# Altium footprint library My Library.PcbLib: 872 footprints (part 16 of 55)
Each footprint in its own frame and in the unit in brackets; x right, y up, seen from the top. Pads: shape width x height; smd on the part's side, far side on the other; paste and mask are expansions set on the pad; w line width, h text height; cw(c..) or ccw(c..) is an arc to the next point about the centre after c.
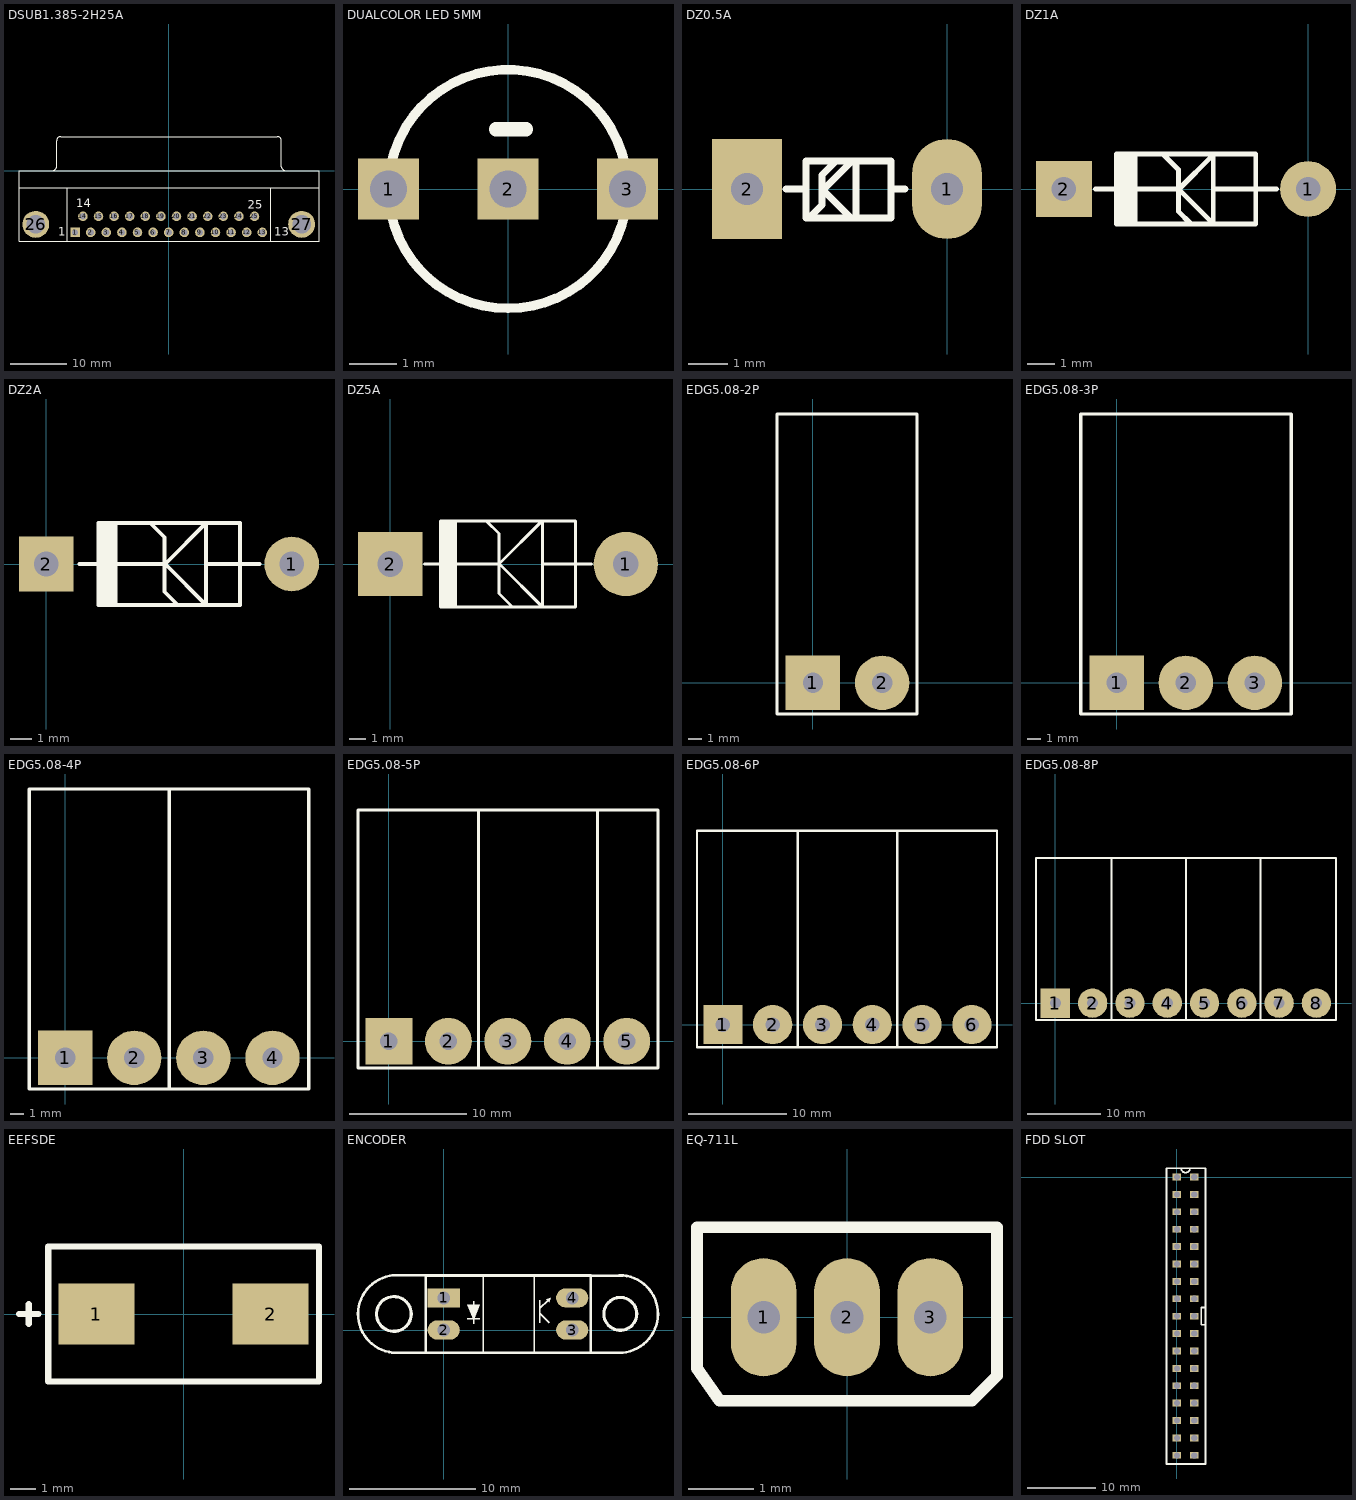
[diagram p15: the footprints below, top view; thin cyan lines are the x and y axes]

## DSUB1.385-2H25A [mm] "Connector; D Subminiature; 25 Position; Right Angle; Pitch 1.385 mm"
height 12.93
pads (27):
  rect 1.69x1.69 hole 1.09: 1(-16.566,-10.92)
  round 1.69 hole 1.09: 2(-13.805,-10.92) 3(-11.044,-10.92) 4(-8.283,-10.92) 5(-5.522,-10.92) 6(-2.761,-10.92) 7(0,-10.92) 8(2.761,-10.92) 9(5.522,-10.92) 10(8.283,-10.92) 11(11.044,-10.92) 12(13.805,-10.92) 13(16.566,-10.92) 14(-15.185,-8.08) 15(-12.424,-8.08) 16(-9.663,-8.08) 17(-6.902,-8.08) 18(-4.141,-8.08) 19(-1.38,-8.08) 20(1.381,-8.08) 21(4.142,-8.08) 22(6.903,-8.08) 23(9.664,-8.08) 24(12.425,-8.08) 25(15.186,-8.08)
  round 4.76 hole 3.26: 26(-23.526,-9.5) 27(23.526,-9.5)
Top Overlay:
  lines w0.2: -26.496,-3 26.604,-3 ; -20.541,0.005 ccw(c-20.541,0.7) -19.846,0.7 -19.846,5.3 ; -19.841,5.305 cw(c-19.146,5.305) -19.146,6 19.254,6 cw(c19.254,5.305) 19.949,5.305 ; -17.946,-12.5 -17.946,-3 ; 18.054,-12.5 18.054,-3 ; 19.954,5.3 19.954,0.7 ccw(c20.649,0.7) 20.649,0.005 ; -26.496,-12.5 -26.496,0 26.604,0 26.604,-12.5 -26.496,-12.5
  text "25" at 13.97,-6.731 h1.5
  text "14" at -16.383,-6.477 h1.5
  text "13" at 18.669,-11.557 h1.5
  text "1" at -19.558,-11.557 h1.5
3D body "SW3dPS-d-sub25 connector.STEP": height 12.57, standoff -4.58, extent -26.492,-12.497 26.548,8.003

## DUALCOLOR LED 5MM [mil]
pads (3):
  rect 51.17x51.17 / inner rect 52x52 / far side rect 51.17x51.17 hole 31: 1(-100,0)
  rect 51.17x51.17 / inner round 52 / far side rect 51.17x51.17 hole 31: 2(0,0) 3(100,0)
Top Overlay:
  lines w8: 80.64,59.14 cw(c0,0) 100,0 ; 100,0 cw(c0,0) 0,-100 cw(c0,0) -100,0 cw(c0,0) 100,0
  lines w11.82: -10,50 15,50

## DZ0.5A [mil] "Diode Zenner, W 80mil, L 300mil"
height 80
pads (2):
  oval 70x100 hole 32: 1(0,0)
  rect 70x100 hole 32: 2(-200,0)
Top Overlay:
  lines w7: -161,0 -141,0 ; -138,-29 -125,-16 -125,14 -111.5,27.5 ; -125,-2 -125,0 ; -95,28 -123,0 -125,0 ; -91,28 -91,-27 -89,-29 -93,-29 -96,-29 -125,0 ; -56,0 -42,0 ; -141,-29 -56,-29 -56,28 -141,28 -141,-29

## DZ1A [mil] "Diode 1A, W 100mil, L 350mil"
height 100
pads (2):
  round 80 hole 35: 1(0,0)
  rect 80x80 hole 35: 2(-350,0)
Top Overlay:
  region: -275,50 -275,-50 -245,-50 -245,50
  lines w7: -305,0 -275,0 ; -275,-16 -275,0 ; -275,21 -275,0 ; -255,0 -190,0 ; -208,50 -186,28 -186,-32 -168.5,-49.5 ; -185.5,-0.5 -136,-50 -136,50 -136,49 -185,0 -185,-1 ; -135,0 -75,0 -45,0 ; -275,0 -275,-50 -75,-50 -75,50 -275,50 -275,0
3D body "SW3dPS-Zener 1W.STEP": height 120.61, standoff -50, extent -346,-65 -15,40

## DZ2A [mil] "Diode 2A, W 150mil, L 450mil"
height 100
pads (2):
  round 100 hole 45: 1(450,0)
  rect 100x100 hole 45: 2(0,0)
Top Overlay:
  region: 95,75 95,-75 130,-75 130,75
  lines w7: 61,0 96,0 ; 96,-31 96,0 ; 96,32 96,0 ; 115,0 215,0 ; 194,72 217,49 217,-51 239,-73 ; 218,1 218,0 ; 295,0 360,0 ; 355,0 391,0 ; 218,0 293,-75 293,75 218,0 ; 96,-75 355,-75 355,75 96,75 96,-75
3D body "SW3DPS-DIODE0_4-DEFAULT.STEP": height 100.5, standoff -100, extent -5,-46 425,55

## DZ5A [mil] "Diode 5A, W 200mil, L 550mil"
height 150
pads (2):
  round 150 hole 60: 1(550,0)
  rect 150x150 hole 60: 2(0,0)
Top Overlay:
  region: 115,100 115,-100 155,-100 155,100
  lines w7: 80,0 118,0 ; 118,-44 118,0 ; 118,46 118,0 ; 150,0 255,0 355,-100 355,100 354,100 254,0 ; 225,100 254,71 ; 254,-5 254,6 ; 254,70 254,-69 283,-98 ; 355,0 435,0 ; 432,0 470,0 ; 118,-100 118,100 432,100 432,-100 118,-100

## EDG5.08-2P [mm]
pads (2):
  rect 4x4 hole 1.5: 1(0,0)
  round 4 hole 1.5: 2(5.08,0)
Top Overlay:
  lines w0.254: -2.642,-2.286 -2.642,19.761 7.645,19.761 7.645,-2.286 -2.642,-2.286
3D body "User Library-MSTB 2,5-2-G 1754436.STEP": height 8.61, standoff -3.49, extent -2.435,-2.007 7.565,9.993
3D body "1911965.stp": height 15.01, standoff 0.01, extent -2.515,1.441 7.645,19.641

## EDG5.08-3P [mm]
pads (3):
  rect 4x4 hole 1.5: 1(0,0)
  round 4 hole 1.5: 2(5.08,0) 3(10.16,0)
Top Overlay:
  lines w0.254: -2.642,-2.286 -2.642,19.761 12.827,19.761 12.827,-2.286 -2.642,-2.286
3D body "1911965.stp": height 15.01, standoff 0.01, extent 2.565,1.441 12.725,19.641
3D body "User Library-MSTB 2,5-2-G 1754436.STEP": height 8.61, standoff -3.49, extent 2.645,-2.007 12.645,9.993
3D body "User Library-MSTB 2,5-2-G 1754436.STEP": height 8.61, standoff -3.49, extent -2.435,-2.007 7.565,9.993
3D body "1911965.stp": height 15.01, standoff 0.01, extent -2.515,1.441 7.645,19.641

## EDG5.08-4P [mm]
pads (4):
  rect 4x4 hole 1.5: 1(0,0)
  round 4 hole 1.5: 2(5.08,0) 3(10.16,0) 4(15.24,0)
Top Overlay:
  lines w0.254: 7.645,-2.286 7.645,19.761 ; -2.642,-2.286 -2.642,19.761 17.907,19.761 17.907,-2.286 -2.642,-2.286
3D body "1911965.stp": height 15.01, standoff 0.01, extent 7.645,1.441 17.805,19.641
3D body "User Library-MSTB 2,5-2-G 1754436.STEP": height 8.61, standoff -3.49, extent 7.725,-2.007 17.725,9.993
3D body "User Library-MSTB 2,5-2-G 1754436.STEP": height 8.61, standoff -3.49, extent -2.435,-2.007 7.565,9.993
3D body "1911965.stp": height 15.01, standoff 0.01, extent -2.515,1.441 7.645,19.641

## EDG5.08-5P [mm]
pads (5):
  rect 4x4 hole 1.5: 1(0,0)
  round 4 hole 1.5: 2(5.08,0) 3(10.16,0) 4(15.24,0) 5(20.32,0)
Top Overlay:
  lines w0.254: 7.645,-2.286 7.645,19.761 ; 17.805,19.761 17.805,-2.286 17.831,-2.286 ; -2.642,-2.286 22.987,-2.286 22.987,19.761 -2.642,19.761 -2.642,-2.286
3D body "1911965.stp": height 15.01, standoff 0.01, extent -2.515,1.441 7.645,19.641
3D body "User Library-MSTB 2,5-2-G 1754436.STEP": height 8.61, standoff -3.49, extent -2.435,-2.007 7.565,9.993
3D body "User Library-MSTB 2,5-2-G 1754436.STEP": height 8.61, standoff -3.49, extent 7.725,-2.007 17.725,9.993
3D body "1911965.stp": height 15.01, standoff 0.01, extent 7.645,1.441 17.805,19.641
3D body "User Library-MSTB 2,5-2-G 1754436.STEP": height 8.61, standoff -3.49, extent 12.805,-2.007 22.805,9.993
3D body "1911965.stp": height 15.01, standoff 0.01, extent 12.725,1.441 22.885,19.641

## EDG5.08-6P [mm]
pads (6):
  rect 4x4 hole 1.5: 1(0,0)
  round 4 hole 1.5: 2(5.08,0) 3(10.16,0) 4(15.24,0) 5(20.32,0) 6(25.4,0)
Top Overlay:
  lines w0.254: 7.645,-2.286 7.645,19.761 ; 17.907,-2.286 -2.642,-2.286 -2.642,19.761 17.907,19.761 ; 17.78,-2.286 27.965,-2.286 27.965,19.761 17.78,19.761 17.78,-2.286
3D body "1911965.stp": height 15.01, standoff 0.01, extent 7.645,1.441 17.805,19.641
3D body "User Library-MSTB 2,5-2-G 1754436.STEP": height 8.61, standoff -3.49, extent 7.725,-2.007 17.725,9.993
3D body "User Library-MSTB 2,5-2-G 1754436.STEP": height 8.61, standoff -3.49, extent -2.435,-2.007 7.565,9.993
3D body "1911965.stp": height 15.01, standoff 0.01, extent -2.515,1.441 7.645,19.641
3D body "1911965.stp": height 15.01, standoff 0.01, extent 17.805,1.441 27.965,19.641
3D body "User Library-MSTB 2,5-2-G 1754436.STEP": height 8.61, standoff -3.49, extent 17.885,-2.007 27.885,9.993

## EDG5.08-8P [mm]
pads (8):
  rect 4x4 hole 1.5: 1(0,0)
  round 4 hole 1.5: 2(5.08,0) 3(10.16,0) 4(15.24,0) 5(20.32,0) 6(25.4,0) 7(30.48,0) 8(35.56,0)
Top Overlay:
  lines w0.254: 7.645,-2.286 7.645,19.761 ; 17.805,19.761 17.805,-2.286 17.831,-2.286 ; 27.965,-2.286 27.965,19.761 ; -2.642,-2.286 38.227,-2.286 38.227,19.761 -2.642,19.761 -2.642,-2.286
3D body "1911965.stp": height 15.01, standoff 0.01, extent -2.515,1.441 7.645,19.641
3D body "User Library-MSTB 2,5-2-G 1754436.STEP": height 8.61, standoff -3.49, extent -2.435,-2.007 7.565,9.993
3D body "User Library-MSTB 2,5-2-G 1754436.STEP": height 8.61, standoff -3.49, extent 7.725,-2.007 17.725,9.993
3D body "1911965.stp": height 15.01, standoff 0.01, extent 7.645,1.441 17.805,19.641
3D body "User Library-MSTB 2,5-2-G 1754436.STEP": height 8.61, standoff -3.49, extent 17.885,-2.007 27.885,9.993
3D body "1911965.stp": height 15.01, standoff 0.01, extent 17.805,1.441 27.965,19.641
3D body "User Library-MSTB 2,5-2-G 1754436.STEP": height 8.61, standoff -3.49, extent 28.045,-2.007 38.045,9.993
3D body "1911965.stp": height 15.01, standoff 0.01, extent 27.965,1.441 38.125,19.641

## EEFSDE [mm]
pads (2):
  rect 3x2.4 smd: 1(-3.429,0) 2(3.429,0)
Top Overlay:
  lines w0.254: -6.477,0 -5.715,0 ; -6.096,-0.381 -6.096,0.381 ; -5.334,-2.658 -5.334,2.658 5.334,2.658 5.334,-2.658 -5.334,-2.658
3D body: height 4.2, standoff 0.1, extent -3.65,-2.15 3.65,2.15
3D body: height 0.1, standoff 0, extent -1.778,-2.15 1.778,2.15
3D body: height 0.1, standoff 0, extent -3.81,-1.27 -1.778,1.27
3D body: height 2.1, standoff 0, extent -3.81,-1.27 -3.556,1.27
3D body: height 2.1, standoff 0, extent 3.556,-1.27 3.81,1.27
3D body: height 0.1, standoff 0, extent 1.778,-1.27 3.81,1.27
3D body: height 4.21, standoff 4.2, extent -3.429,-2.15 -2.794,2.15

## ENCODER [mil]
pads (4):
  rect 100x60 hole 40: 1(0,100)
  oval 100x60 hole 40: 2(0,0) 3(400,0) 4(400,100)
Top Overlay:
  circle w10: c-154.96,50 r54.16
  circle w10: c549.9,50.3 r51.2
  region: 112.8,78.45 92.8,30.95 72.8,78.45
  region: 318.92,95.72 328.24,86.74 333.76,100.66
  lines w4: 72.8,34.7 112.8,34.7 ; 92.8,19.7 92.8,89.7 ; 123.5,-70.6 123.5,169.4 ; 281.7,-70.8 281.7,169.2 ; 299,22.9 299,40.4 299,75.4 299,92.9 ; 299,52.9 329,22.9 ; 299.63,67.27 325,92.63
  lines w8: -162.4,-70.2 -51.6,-70.2 ; -160.1,169.9 -54.8,169.9 ; -146.18,-70.65 cw(c-146.18,49.98) -145,170.6 ; 455.3,169.4 556.9,169.4 ; 457.9,-70.5 554,-70.5 ; 545.32,-70.65 ccw(c546.5,49.97) 546.5,170.6 ; -55.8,-70.3 -55.8,169.7 458,169.7 458,-70.3 -55.8,-70.3

## EQ-711L [mm] "TO-92"
height 5.08
pads (3):
  oval 1x1.8 hole 0.5: 1(-1.27,0) 2(0,0) 3(1.27,0)
Top Overlay:
  lines w0.178: -2.286,-0.78 -2.286,1.37 2.286,1.37 2.286,-0.889 1.905,-1.27 -1.943,-1.27 -2.286,-0.78
3D body: height 8.5, standoff -1.5, extent 0.873,-0.399 1.67,0.399
3D body: height 11.2, standoff 8, extent -2.159,-1.143 2.159,1.27
3D body: height 8.5, standoff -1.5, extent -0.397,-0.399 0.4,0.399
3D body: height 8.5, standoff -1.5, extent -1.667,-0.399 -0.87,0.399

## FDD SLOT [mm] "Khe cam cap o dia mem"
pads (34):
  rect 1.27x1 hole 0.889: 1(0,0) 2(0,-2.54) 3(0,-5.08) 4(0,-7.62) 5(0,-10.16) 6(0,-12.7) 7(0,-15.24) 8(0,-17.78) 9(0,-20.32) 10(0,-22.86) 11(0,-25.4) 12(0,-27.94) 13(0,-30.48) 14(0,-33.02) 15(0,-35.56) 16(0,-38.1) 17(0,-40.64) 18(2.54,-40.64) 19(2.54,-38.1) 20(2.54,-35.56) 21(2.54,-33.02) 22(2.54,-30.48) 23(2.54,-27.94) 24(2.54,-25.4) 25(2.54,-22.86) 26(2.54,-20.32) 27(2.54,-17.78) 28(2.54,-15.24) 29(2.54,-12.7) 30(2.54,-10.16) 31(2.54,-7.62) 32(2.54,-5.08) 33(2.54,-2.54) 34(2.54,0)
Top Overlay:
  lines w0.254: 4.191,-21.59 3.556,-21.59 3.556,-19.05 4.191,-19.05 ; -1.524,-41.91 -1.524,1.27 1.016,1.27 1.905,1.27 cw(c1.27,1.27) 0.635,1.27 1.524,1.27 4.191,1.27 4.191,-41.91 -1.524,-41.91